# Altium schematic symbol library lib_datalogger.SchLib: 1246 symbols (part 3 of 16) (continued)
## CMP-004-00007-3
designator D?, comment 1N4007
General Purpose Rectifier, 1.1 V, 1.0 A, -55 to 175 degC, 2-Pin DO-41, RoHS, Tape and Reel; Manufacturer: Fairchild; Package Version: Rev. 2, 09/2008; Forward Current: 1A; Elements: 1; Max Surge Current: 30A; Peak Reverse Current: 5uA; Forward Voltage: 1.1V; Package Reference: DO-41-2; Package Description: 2-Pin Axial Lead, Dia 2.375 mm, Body Length 4.63 mm; Min Operating Temperature: -55°C; Packaging: TapeandReel; Max Operating Temperature: 175°C; Pins: 2; Package Quantity: 5000; Datasheet URL: https://www.fairchildsemi.com/datasheets/1N/1N4007.pdf; Case/Package: DO-41-2; Package URL: http://www.fairchildsemi.com/dwg/DO/DO41A.pdf; RoHS Compliant: True; Mounting Technology: TH; Datasheet Version: Rev. 1.1.0, 11/2014; Manufacturer URL: https://www.fairchildsemi.com/
footprint FAIR-DO-41-2-1 (THD, 2-Leads, Body 5.2x2.72mm, Pin Spacing 7.8mm)
pins: 1 K, 2 A

## CMP-004-000008-1
designator C?, comment CAP ALUM 330UF 20% 50V SMD  Tolerance: ±20%  Packaging: Cut Tape (CT)  Capacitance: 330µF  Manufacturer: Panasonic Electronic Components  Voltage Rating: 50V  Ripple Current: 585mA
Manufacturer Part Number: EEE-FT1H331AP; Polarization: Polar; Surface Mount Land Size: 0.406" L x 0.406" W (10.30mm x 10.30mm); ESR (Equivalent Series Resistance): 120 mOhm @ 100kHz; Lifetime @ Temp.: 2000 Hrs @ 105°C; ComponentLink1URL: https://industrial.panasonic.com/cdbs/www-data/pdf/RDE0000/ABA0000C573.pdf; Impedance: -; Applications: General Purpose; Mounting Type: Surface Mount; Pricing 1: 1=1.04, 10=0.818, 25=0.75, 50=0.709, 100=0.6135, 250=0.54536 (USD); Stock 1: 74009; ComponentLink1Description: https://industrial.panasonic.com/cdbs/www-data/pdf/RDE0000/ABA0000C573.pdf; Lead Spacing: -; Height - Seated (Max): 0.413" (10.50mm); Operating Temperature: -55°C ~ 105°C; Design Item ID: CAP ALUM 330UF 20% 50V SMD; Size / Dimension: 0.394" Dia (10.00mm); Category: Capacitors; RoHS: RoHS Compliant; Source: mits.SchLib; Part Status: Active; Package / Case: Radial, Can - SMD
footprint CAP_SMD_D100_P46_H120
footprint CAP_SMD_D100_P46_H120
pins: 1, 2
1 alternate drawing of the same symbol

## CMP-004-00008-2
designator D?, comment MBR360G
Axial Lead Rectifier, 60 V, 3 A, -65 to 150 degC, 2-Pin DO-201AD, RoHS, Bag; Manufacturer: ON Semiconductor; Forward Current: 3A; Forward Voltage: 1.08V; Peak Reverse Current: 600uA; Max Surge Current: 80A; Package URL: http://www.onsemi.com/pub_link/Collateral/267-05.PDF; Datasheet URL: http://www.onsemi.cn/pub_link/Collateral/MBR350-D.PDF; Package Description: 2-Pin Axial Lead, Dia 5.05 mm, Body Length 8.4 mm; Package Reference: AXIAL_LEAD-2-267-05; Diameter: 5.3mm; Datasheet Version: Rev. 6, 06/2006; Package Quantity: 500; Packaging: Bulk; Manufacturer URL: http://www.onsemi.com/; Pins: 2; Max Operating Temperature: 150°C; Min Operating Temperature: -65°C; Mounting Technology: TH; RoHS Compliant: True; Case/Package: AXIAL_LEAD-2-267-05
footprint ONSC-AXIAL_LEAD-2-267-05_V (AXIAL, 2-Leads, Diameter 5.05mm)
pins: 1 A, 2 K

## CMP-004-000009-1
designator C?, comment CAP ALUM 330uF 35V 20% SMD  Manufacturer: Panasonic Electronic Components
Part#: EEE-FK1V331P; eVendor#: PCE3841CT-ND; eVendorPrice: 1,09; MSRP: 0,54; eVendor: Digi-Key; MOQ: 250; Source: mits.SchLib; Datasheet: http://industrial.panasonic.com/www-cgi/jvcr13pz.cgi?E+PZ+3+ABA0120+EEEFK1V331P+7+WW; Design Item ID: CAP ALUM 330uF 35V 20% SMD
footprint CAP_SMD_D5_H6
footprint CAP_SMD_D100_P46_H120
pins: 1, 2
1 alternate drawing of the same symbol

## CMP-004-00009-2
designator D?, comment 1N5819
Low Drop Power Schottky Rectifier, 40 V, 1 A, 2-Pin DO-41, RoHS; Manufacturer: ON Semiconductor; Max Surge Current: 25A; Forward Current: 1A; Package Version: Rev. U, 02/2005; Peak Reverse Current: 1mA; Max Operating Temperature: 125°C; Case/Package: DO; Package URL: http://www.onsemi.cn/pub_link/Collateral/59-10.PDF; Packaging: Bulk; Manufacturer URL: http://www.onsemi.com/; Min Operating Temperature: -65°C; Package Description: 2-Pin, Axial Lead, Diameter 2.35 mm; Mounting Technology: TH; Datasheet URL: http://www.onsemi.cn/pub_link/Collateral/1N5817-D.PDF; Datasheet Version: Rev. 10, 07/2006; Package Reference: AXIAL_LEAD-2-59-10; Pins: 2; RoHS Compliant: True
footprint ONSC-AXIAL_LEAD-2-59-10_P (AXIAL, 2-Leads, Diameter 2.35mm)
pins: 1 A, 2 K

## CMP-004-00010-2
designator D?, comment BAS70-04,215
General-Purpose Schottky Diode, 70 V, 70 mA, -65 to 150 degC, 3-Pin SOT23, RoHS, Tape and Reel; Manufacturer: NXP; Max Surge Current: 100mA; Forward Current: 70mA; Peak Reverse Current: 10uA; Package Version: Feb-16; Forward Voltage: 1V; Packaging: TapeandReel; Mounting Technology: SM; Datasheet Version: Rev. 09, 01/2010; Datasheet URL: http://www.nxp.com/documents/data_sheet/BAS70_1PS7XSB70_SER.pdf; Package Quantity: 3000; Min Operating Temperature: -65°C; RoHS Compliant: True; Pins: 3; Package Reference: SOT23-3; Package Description: 3-Pin Small Outline Transistor, Body 1.3 x 2.9 mm, Pitch 0.95 mm; Case/Package: TO-236-3; Package URL: http://www.nxp.com/documents/outline_drawing/SOT23.pdf; Manufacturer URL: http://www.nxp.com/; Max Operating Temperature: 150°C
footprint NXP-SOT23-3_V (SOT23, 3-Leads, Body 2.9x1.3mm, Pitch 0.95mm)
pins: 1 A, 2 K, 3 C

## CMP-004-000010-3
designator C?, comment CAP ALUM 4.7UF 20% 35V SMD  Case/Package: Radial  Packaging: Cut Tape (CT)  Capacitance: 10µF  Voltage Rating: 16V  Tolerance: ±20%  Package Quantity: 2000  Min Operating Temperature: -40°C  Ripple Current (AC): 18mA  Lead Pitch: 1mm  Diameter: 4mm  Ripple Current: 28mA  Max Operating Temperature: 85°C  Manufacturer: Panasonic Electronic Components
Manufacturer Part Number: EEE-HB1C100R; Dielectric Material: Aluminium; Life (Hours): 2000Hour; Surface Mount Land Size: 0.169" L x 0.169" W (4.30mm x 4.30mm); Lead Diameter: 0.8mm; Leakage Current: 3uA; Lifetime @ Temp.: 2000 Hrs @ 105°C; Polarization: Polar; Dissipation Factor: 0.12%; ComponentLink1Description: https://industrial.panasonic.com/cdbs/www-data/pdf/RDE0000/ABA0000C1157.pdf; ComponentLink9Description: https://datasheet.ciiva.com/28640/1912851-28640459.pdf?src-supplier=Element14; Width: 0.25inch; Termination: SMD/SMT; ComponentLink3URL: https://datasheet.ciiva.com/96/e-wx-96069.pdf?src-supplier=Digi-Key; Pricing 1: 1=0.31, 10=0.21, 25=0.1684, 50=0.1402, 100=0.1192, 250=0.09468, 500=0.08414, 1000=0.07363 (USD); Pricing 2: 1=0,27000, 10=0,18300, 100=0,10390, 500=0,07334, 1000=0,06418 (USD); Part Status: Active; Category: Capacitors; Size / Dimension: 0.157" Dia (4.00mm); Lead Free: Lead Free; Weight: 0.01lb; ComponentLink7URL: https://datasheet.ciiva.com/11688/e-wx-11688390.pdf?src-supplier=Avnet; ComponentLink4URL: https://datasheet.ciiva.com/30522/getdatasheetpartid-427113-30522272.pdf?src-supplier=Verical; Radiation Hardening: No; ComponentLink2Description: https://datasheet.ciiva.com/96/e-wx-96068.pdf?src-supplier=Digi-Key; Contact Plating: Tin; Height - Seated (Max): 0.228" (5.80mm); Stock 3: 17093; Mounting Type: Surface Mount; ComponentLink10URL: https://datasheet.ciiva.com/16539/e-wx-16539500.pdf?src-supplier=Avnet+Asia; ComponentLink11URL: https://datasheet.ciiva.com/17534/e-wx-17534878.pdf?src-supplier=Avnet+Europe; ComponentLink11Description: https://datasheet.ciiva.com/17534/e-wx-17534878.pdf?src-supplier=Avnet+Europe; ComponentLink3Description: https://datasheet.ciiva.com/96/e-wx-96069.pdf?src-supplier=Digi-Key; Lead Spacing: -; Stock 1: 25234; ComponentLink4Description: https://datasheet.ciiva.com/30522/getdatasheetpartid-427113-30522272.pdf?src-supplier=Verical; ESR (Equivalent Series Resistance): -; Pricing 3: 1=0,27000, 10=0,18300, 100=0,10390, 500=0,07334, 1000=0,06418 (USD); ComponentLink6URL: https://datasheet.ciiva.com/96/e-wx-96070.pdf?src-supplier=Digi-Key; ComponentLink2URL: https://datasheet.ciiva.com/96/e-wx-96068.pdf?src-supplier=Digi-Key; Length: 5.4mm; ComponentLink5URL: https://datasheet.ciiva.com/11782/0900766b80fa3a90-11782001.pdf?src-supplier=RSComponents; ComponentLink9URL: https://datasheet.ciiva.com/28640/1912851-28640459.pdf?src-supplier=Element14; ComponentLink6Description: https://datasheet.ciiva.com/96/e-wx-96070.pdf?src-supplier=Digi-Key; Mount: Surface Mount,PCB; RoHS: RoHS Compliant; ComponentLink5Description: https://datasheet.ciiva.com/11782/0900766b80fa3a90-11782001.pdf?src-supplier=RSComponents; Source: mits.SchLib; REACH SVHC: No SVHC; ComponentLink10Description: https://datasheet.ciiva.com/16539/e-wx-16539500.pdf?src-supplier=Avnet+Asia; Number of Pins: 2; Stock 2: 17093; Operating Temperature: -40°C ~ 105°C; ComponentLink8URL: https://datasheet.ciiva.com/5360/e-wx-11809-5360377.pdf?src-supplier=Mouser; Height: 5.4mm; Applications: Automotive; Package / Case: Radial, Can - SMD; Design Item ID: CAP ALUM 4.7UF 20% 35V SMD; Impedance: -; ComponentLink8Description: https://datasheet.ciiva.com/5360/e-wx-11809-5360377.pdf?src-supplier=Mouser; Voltage Rating (DC): 35V; Voltage: 35V; ComponentLink1URL: https://industrial.panasonic.com/cdbs/www-data/pdf/RDE0000/ABA0000C1157.pdf; ComponentLink7Description: https://datasheet.ciiva.com/11688/e-wx-11688390.pdf?src-supplier=Avnet
footprint CAP_SMD_D5_H6
footprint CAP_SMD_D4
pins: 1, 2
1 alternate drawing of the same symbol

## CMP-004-000011-1
designator C?, comment CAP ALUM 470uF 35V 20% SMD  Package Quantity: 1  Max Operating Temperature: 105°C  Tolerance: 20%  Capacitance: 470uF  Min Operating Temperature: -55°C  Case/Package: Radial  Manufacturer: Nichicon  Voltage Rating: 35V  Packaging: Tape and Reel  Diameter: 10mm  Ripple Current (AC): 1.19A
CAP ALUM 470UF 20% 35V SMD; Manufacturer Part Number: UCL1V471MNL1GS; Life (Hours): 2000Hour; Leakage Current: 3uA; Material: Aluminium; Dissipation Factor: 0.12%; Impedance: 60mR; Pricing 1: 1=1,06000, 10=0,80300, 100=0,57450 (USD); ComponentLink13URL: https://datasheet.ciiva.com/24229/aba0000ce120-24229287.pdf?src-supplier=Mouser; Design Item ID: CAP ALUM 470uF 35V 20% SMD; ComponentLink6Description: https://datasheet.ciiva.com/14599/70258115-14599980.pdf?src-supplier=Allied+Electronics; ComponentLink5Description: https://datasheet.ciiva.com/15225/getdatasheetpartid-199809-15225692.pdf?src-supplier=Verical; ComponentLink23Description: https://datasheet.ciiva.com/28458/1910939-28458006.pdf?src-supplier=Element14; ComponentLink14URL: https://datasheet.ciiva.com/31417/1676921-31417910.pdf?src-supplier=Farnell; Source: mits.SchLib; Voltage Rating (DC): 35V; ComponentLink11Description: https://datasheet.ciiva.com/8081/1676921-8081433.pdf?src-supplier=Element14; ComponentLink17Description: https://datasheet.ciiva.com/46372/1676921-46372495.pdf?src-supplier=Element14; ComponentLink19URL: https://datasheet.ciiva.com/98/e-cl-98467.pdf?src-supplier=Digi-Key; Length: 13.5mm; ComponentLink9URL: https://datasheet.ciiva.com/14592/70068597-14592122.pdf?src-supplier=Allied+Electronics; ComponentLink24URL: https://datasheet.ciiva.com/6153/e-cl-6153975.pdf?src-supplier=Farnell; ComponentLink5URL: https://datasheet.ciiva.com/15225/getdatasheetpartid-199809-15225692.pdf?src-supplier=Verical; ComponentLink15URL: https://datasheet.ciiva.com/43470/1676921-43470869.pdf?src-supplier=Farnell; Category: Aluminum Electrolytic Capacitors; Stock 1: 36281; ComponentLink1Description: https://datasheet.ciiva.com/11783/0900766b80e4e8b0-11783536.pdf?src-supplier=RSComponents; ComponentLink26URL: https://datasheet.ciiva.com/16502/e-cl-16502287.pdf?src-supplier=Future+Electronics; ComponentLink3URL: https://datasheet.ciiva.com/48483/aba0000ce120-48483341.pdf?src-supplier=Avnet; Mount: Surface Mount; ComponentLink12Description: https://datasheet.ciiva.com/46379/1676921-46379192.pdf?src-supplier=Element14; Termination: SMD/SMT; ComponentLink18Description: https://datasheet.ciiva.com/30521/getdatasheetpartid-743876-30521937.pdf?src-supplier=Verical; ComponentLink11URL: https://datasheet.ciiva.com/8081/1676921-8081433.pdf?src-supplier=Element14; ComponentLink10Description: https://datasheet.ciiva.com/2984/aba0000ce120-2984090.pdf?src-supplier=Avnet; REACH SVHC: No SVHC; ComponentLink20URL: https://datasheet.ciiva.com/98/e-cl-98468.pdf?src-supplier=Digi-Key; ComponentLink24Description: https://datasheet.ciiva.com/6153/e-cl-6153975.pdf?src-supplier=Farnell; ComponentLink6URL: https://datasheet.ciiva.com/14599/70258115-14599980.pdf?src-supplier=Allied+Electronics; ComponentLink26Description: https://datasheet.ciiva.com/16502/e-cl-16502287.pdf?src-supplier=Future+Electronics; ComponentLink4URL: https://datasheet.ciiva.com/30252/eev-fkseries-30252141.pdf?src-supplier=Onlinecomponents.com; ComponentLink22Description: https://datasheet.ciiva.com/22661/1910939-22661894.pdf?src-supplier=Element14; ComponentLink4Description: https://datasheet.ciiva.com/30252/eev-fkseries-30252141.pdf?src-supplier=Onlinecomponents.com; ComponentLink7Description: https://datasheet.ciiva.com/28692/1676921-28692730.pdf?src-supplier=Element14; ComponentLink22URL: https://datasheet.ciiva.com/22661/1910939-22661894.pdf?src-supplier=Element14; ComponentLink19Description: https://datasheet.ciiva.com/98/e-cl-98467.pdf?src-supplier=Digi-Key; ComponentLink16URL: https://datasheet.ciiva.com/17355/aba0000ce120-17355694.pdf?src-supplier=Avnet+Europe; RoHS: Yes; ComponentLink14Description: https://datasheet.ciiva.com/31417/1676921-31417910.pdf?src-supplier=Farnell; ComponentLink16Description: https://datasheet.ciiva.com/17355/aba0000ce120-17355694.pdf?src-supplier=Avnet+Europe; Radiation Hardening: No; ComponentLink2URL: https://datasheet.ciiva.com/29313/443482-da-01-en-smd-elko-vfk-h13-470-uf-35v-29313589.pdf?src-supplier=Conrad; ComponentLink21Description: https://datasheet.ciiva.com/98/e-cl-98469.pdf?src-supplier=Digi-Key; ComponentLink2Description: https://datasheet.ciiva.com/29313/443482-da-01-en-smd-elko-vfk-h13-470-uf-35v-29313589.pdf?src-supplier=Conrad; ComponentLink10URL: https://datasheet.ciiva.com/2984/aba0000ce120-2984090.pdf?src-supplier=Avnet; ComponentLink18URL: https://datasheet.ciiva.com/30521/getdatasheetpartid-743876-30521937.pdf?src-supplier=Verical; Number of Pins: 2; Dielectric Material: Aluminium; ComponentLink25URL: https://datasheet.ciiva.com/11683/e-cl-11683743.pdf?src-supplier=Avnet; ComponentLink12URL: https://datasheet.ciiva.com/46379/1676921-46379192.pdf?src-supplier=Element14; ComponentLink20Description: https://datasheet.ciiva.com/98/e-cl-98468.pdf?src-supplier=Digi-Key; ComponentLink13Description: https://datasheet.ciiva.com/24229/aba0000ce120-24229287.pdf?src-supplier=Mouser; ComponentLink8URL: https://datasheet.ciiva.com/14592/70258115-14592362.pdf?src-supplier=Allied+Electronics; ComponentLink21URL: https://datasheet.ciiva.com/98/e-cl-98469.pdf?src-supplier=Digi-Key; ComponentLink25Description: https://datasheet.ciiva.com/11683/e-cl-11683743.pdf?src-supplier=Avnet; Height: 13.5mm; ComponentLink8Description: https://datasheet.ciiva.com/14592/70258115-14592362.pdf?src-supplier=Allied+Electronics; ComponentLink3Description: https://datasheet.ciiva.com/48483/aba0000ce120-48483341.pdf?src-supplier=Avnet; Lead Free: Lead Free; ComponentLink23URL: https://datasheet.ciiva.com/28458/1910939-28458006.pdf?src-supplier=Element14; ComponentLink15Description: https://datasheet.ciiva.com/43470/1676921-43470869.pdf?src-supplier=Farnell; ComponentLink9Description: https://datasheet.ciiva.com/14592/70068597-14592122.pdf?src-supplier=Allied+Electronics; ComponentLink17URL: https://datasheet.ciiva.com/46372/1676921-46372495.pdf?src-supplier=Element14; ComponentLink7URL: https://datasheet.ciiva.com/28692/1676921-28692730.pdf?src-supplier=Element14; Height - Seated (Max): 0.531inch; ComponentLink1URL: https://datasheet.ciiva.com/11783/0900766b80e4e8b0-11783536.pdf?src-supplier=RSComponents; Ripple Current: 1.19A
footprint CAP_SMD_D5_H6
footprint CAP_SMD_D100_P46_H120
pins: 1, 2
1 alternate drawing of the same symbol

## CMP-004-00011-2
designator D?, comment BAS70-04-7-F
Schottky Barrier Diode, 70 V, 70 mA, -55 to 125 degC, 3-Pin SOT23, RoHS, Tape and Reel; Manufacturer: Diodes Inc; Recovery Time: 5ns; Max Surge Current: 100mA; Forward Voltage: 1V; Forward Current: 70mA; Power: 200mW; Element Configuration: CommonCathode; Peak Reverse Current: 0.1uA; Elements: 2; Manufacturer URL: http://www.diodes.com/; Packaging: TapeandReel; Package Reference: SOT23-3; Mounting Technology: SM; Datasheet URL: http://www.diodes.com/_files/datasheets/ds11007.pdf; Max Operating Temperature: 125°C; Datasheet Version: Rev. 24-2, 08/2014; Min Operating Temperature: -55°C; Pins: 3; Case/Package: TO-236-3; Package Quantity: 3000; Package Description: 3-Pin Small Outline Transistor, Body 2.9 x 1.3 mm, Pitch 0.96 mm; RoHS Compliant: True
footprint DIOD-SOT23-3_V (SOT23, 3-Leads, Body 3x1.4mm, Pitch 0.95mm)
pins: 1 A, 2 K, 3 C

## CMP-004-000012-2
designator C?, comment CAP CER 150nF 16V 0603 SMD
CAP CER 150nF 16V 0603 Multilayer; Manufacturer 1: FH(Guangdong Fenghua Advanced Tech); Manufacturer Part Number 1: 0603B154K160NT; Source: mits.SchLib; Supplier Unit Price 1: 0,0207; Design Item ID: CAP CER 150nF 16V 0603 SMD
footprint CC1005-0402 (Chip Capacitor; Body 0.039" L x 0.020" W (1.00mm x 0.50mm))
footprint CC1608-0603 (Chip Capacitor; Body 1.6 x 0.8 mm (LxW typ))
pins: 1, 2

## CMP-004-00012-2
designator D?, comment BAS70-04-E3-08
Small Signal Schottky Diode, 70 V, 200 mA, -55 to 125 degC, 3-Pin SOT23, RoHS, Tape and Reel; Manufacturer: Vishay Semiconductor; Max Surge Current: 600mA; Forward Voltage: 1V; RoHS Compliant: True; Min Operating Temperature: -55°C; Datasheet Version: Rev. 2.0, 02/2013; Datasheet URL: http://www.vishay.com/docs/85702/bas70.pdf; Package Reference: SOT23-3; Package URL: http://www.vishay.com/docs/71196/71196.pdf; Manufacturer URL: http://www.vishay.com/; Pins: 3; Package Description: 3-Pin Small Outline Transistor, Body 2.95 x 1.315 mm, Pitch 0.95 mm; Max Operating Temperature: 125°C; Mounting Technology: SM; Packaging: TapeandReel; Package Quantity: 1; Case/Package: TO-236-3
footprint VISH-SOT23-3_V (SOT23, 3-Leads, Body 3.1x1.43mm, Pitch 0.95mm)
pins: 1 A, 2 K, 3 C

## CMP-004-000013-1
designator C?, comment CAP ALUM 100UF 20% 6.3V SMD  Tolerance: ±20%  Voltage Rating: 6.3V  Capacitance: 100µF  Manufacturer: Panasonic Electronic Components  Packaging: Cut Tape (CT)  Ripple Current: 47mA
Manufacturer Part Number: EEE-0JA101WR; Polarization: Polar; Surface Mount Land Size: 0.209" L x 0.209" W (5.30mm x 5.30mm); Lifetime @ Temp.: 1000 Hrs @ 85°C; Height - Seated (Max): 0.213" (5.40mm); Stock 1: 70730; Source: mits.SchLib; ESR (Equivalent Series Resistance): -; Part Status: Active; ComponentLink1URL: https://industrial.panasonic.com/cdbs/www-data/pdf/RDE0000/ABA0000C1145.pdf; Lead Spacing: -; Design Item ID: CAP ALUM 100UF 20% 6.3V SMD; ComponentLink1Description: https://industrial.panasonic.com/cdbs/www-data/pdf/RDE0000/ABA0000C1145.pdf; Operating Temperature: -40°C ~ 85°C; RoHS: RoHS Compliant; Applications: General Purpose; Package / Case: Radial, Can - SMD; Mounting Type: Surface Mount; Size / Dimension: 0.197" Dia (5.00mm); Pricing 1: 1=0.29, 10=0.201, 25=0.1648, 50=0.1408, 100=0.1206, 250=0.10052, 500=0.09048 (USD); Impedance: -; Category: Capacitors
footprint CAP_SMD_D5_H6
footprint CAP_SMD_D5_H6
pins: 1, 2
1 alternate drawing of the same symbol

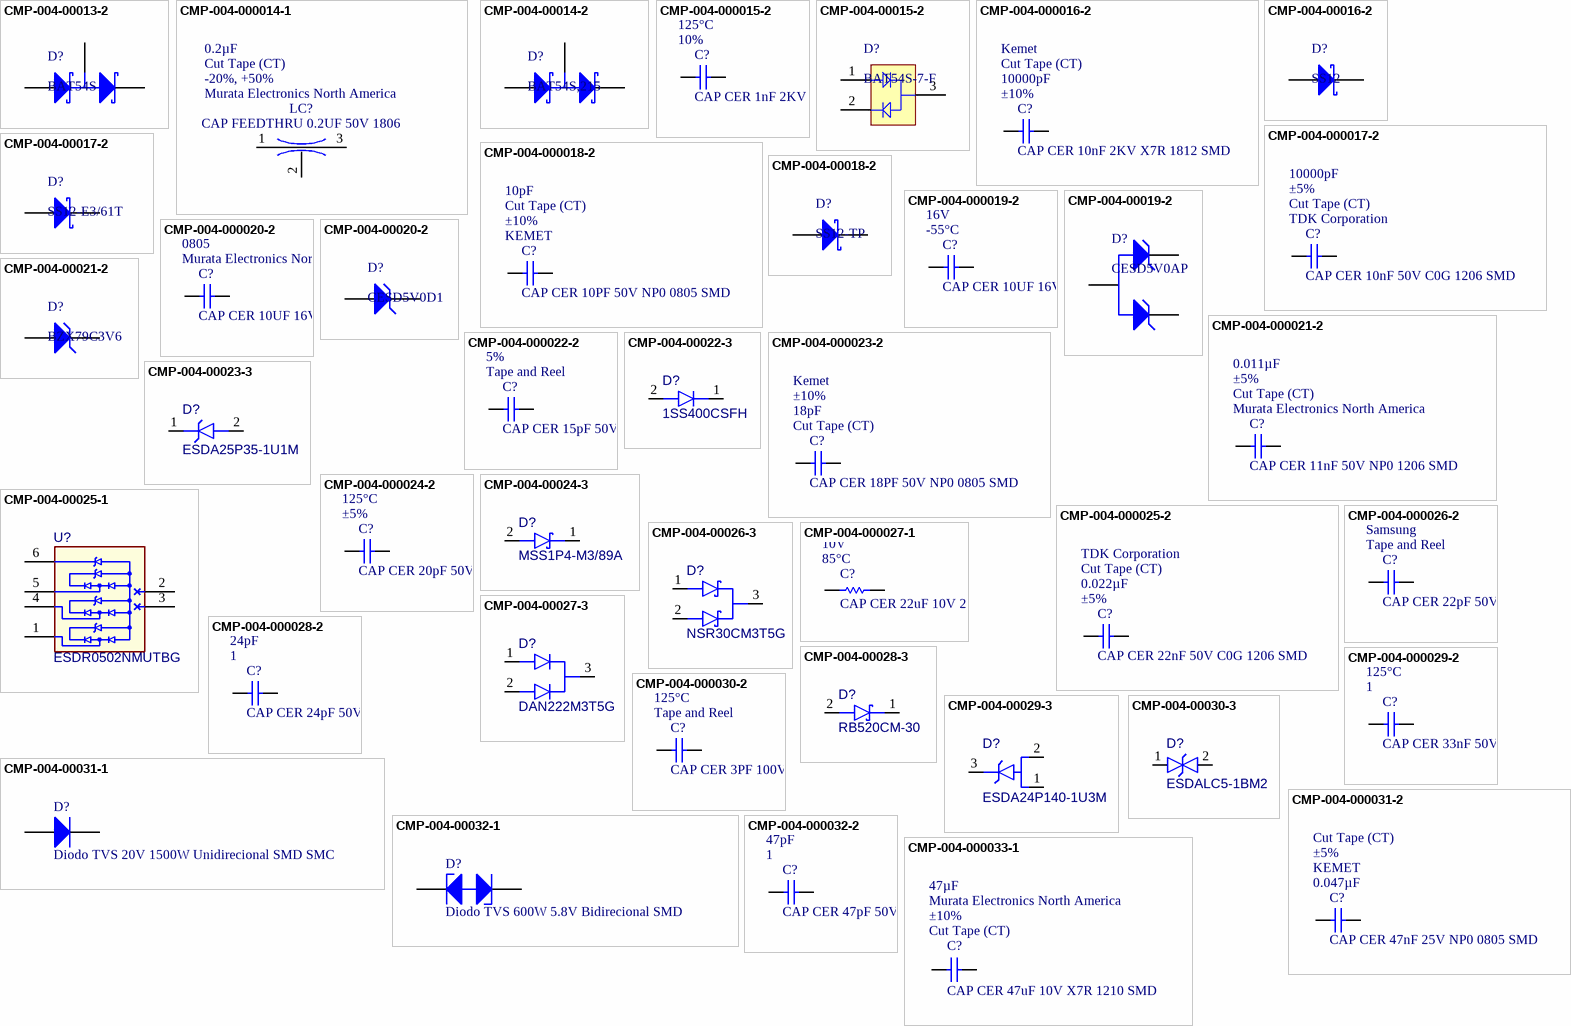
[diagram p8: symbols CMP-004-00013-2 to CMP-004-000033-1]

## CMP-004-00013-2
designator D?, comment BAT54S
Schottky Barrier Diode, 30 V, 0.2 A, -55 to 150 degC, 3-Pin SOT23, RoHS, Tape and Reel; Manufacturer: Fairchild; Recovery Time: 5ns; Package Version: Rev. 12, 03/2016; Forward Current: 200mA; Peak Reverse Current: 2uA; Elements: 2; Forward Voltage: 800mV; Max Surge Current: 600mA; Package Reference: SOT23-3; RoHS Compliant: True; Package URL: http://www.fairchildsemi.com/dwg/MA/MA03D.pdf; Pins: 3; Max Operating Temperature: 150°C; Package Quantity: 3000; Datasheet URL: https://www.fairchildsemi.com/datasheets/BA/BAT54S.pdf; Packaging: TapeandReel; Manufacturer URL: https://www.fairchildsemi.com/; Min Operating Temperature: -55°C; Datasheet Version: Rev. 2.3, 04/2016; Mounting Technology: SM; Package Description: 3-Pin Small Outline Transistor, Body 2.92 x 1.325 mm, Pitch 0.95 mm; Case/Package: SOT-23
footprint FAIR-SOT23-3_V (SOT23, 3-Leads, Body 3.12x1.5mm, Pitch 0.95mm)
pins: 1 A, 2 K, 3 C

## CMP-004-000014-1
designator LC?, comment CAP FEEDTHRU 0.2UF 50V 1806  Manufacturer: Murata Electronics North America  Tolerance: -20%, +50%  Packaging: Cut Tape (CT)  Capacitance: 0.2µF
Manufacturer Part Number: NFM41PC204F1H3L; DC Resistance (DCR) (Max): 40 mOhm; Current: 2A; Source: mits.SchLib; Design Item ID: CAP FEEDTHRU 0.2UF 50V 1806; Thread Size: -; Category: Filters; Temperature Coefficient: -; Mounting Type: Surface Mount; Insertion Loss: -; Pricing 1: 1=0.87, 10=0.832, 25=0.8048, 50=0.6574, 100=0.5902, 250=0.5366, 500=0.50976, 1000=0.45609 (USD); Part Status: Active; Operating Temperature: -55°C ~ 85°C; Package / Case: 1806 (4516 Metric), 3 PC Pad; Size / Dimension: 0.177" L x 0.063" W (4.50mm x 1.60mm); ComponentLink1Description: http://search.murata.co.jp/Ceramy/image/img/A01X/G101/ENG/NFM41PC155B1E3-01.pdf; RoHS: RoHS Compliant; Height (Max): 0.047" (1.20mm); Stock 1: 53274; Ratings: -; Voltage - Rated: 50V; ComponentLink1URL: http://search.murata.co.jp/Ceramy/image/img/A01X/G101/ENG/NFM41PC155B1E3-01.pdf
footprint CC_FT_0805
footprint NFM41C (NFM41C Series Footprint)
pins: 1 Input, 2 GND, 3 Output

## CMP-004-00014-2
designator D?, comment BAT54S,215
BAT54 Series Schottky Barrier Diode, 30 V, 200 mA, -55 to 150 degC, 3-Pin SOT23 (TO-236AB), RoHS, Tape and Reel; Manufacturer: NXP; Peak Reverse Current: 2uA; Elements: 2; Forward Current: 200mA; Forward Voltage: 800mV; Max Surge Current: 600mA; Recovery Time: 5ns; Package URL: http://www.nxp.com/documents/outline_drawing/SOT23.pdf; Pins: 3; Packaging: TapeandReel; Package Reference: SOT23; Datasheet URL: http://www.nxp.com/documents/data_sheet/BAT54_SER.pdf; Package Description: 3-Pin Small Outline Transistor, Body 2.9 x 1.3 mm, Pitch 0.95 mm; Manufacturer URL: http://www.nxp.com/; Case/Package: TO-236-3; Min Operating Temperature: -55°C; Max Operating Temperature: 150°C; Mounting Technology: SM; RoHS Compliant: True; Datasheet Version: Rev. 5, 10/2012; Package Quantity: 3000
footprint NXP-SOT23_L (SOT23, 3-Leads, Body 3x1.4mm, Pitch 0.95mm, IPC High Density)
footprint NXP-SOT23_M (SOT23, 3-Leads, Body 3x1.4mm, Pitch 0.95mm, IPC Low Density)
footprint NXP-SOT23_N (SOT23, 3-Leads, Body 3x1.4mm, Pitch 0.95mm, IPC Medium Density)
pins: 1 A, 2 K, 3 C

## CMP-004-000015-2
designator C?, comment CAP CER 1nF 2KV NP0 1206 SMD  Tolerance: 10%  Max Operating Temperature: 125°C  Capacitance: 1nF  Voltage Rating: 2kV  Package Quantity: 500  Case/Package: 1206  Packaging: Tape and Reel  Min Operating Temperature: -55°C
1NF ±10% 2KV X7R 1206 MULTILAYER CERAMIC CAPACITORS MLCC - SMD/SMT ROHS; Manufacturer Part Number 1: 1206B102K202NT; Manufacturer 1: Knowles Novacap; Height: 1.63mm; Voltage Rating (DC): 2kV; ComponentLink1Description: https://datasheet.lcsc.com/szlcsc/1810311314_FH-Guangdong-Fenghua-Advanced-Tech-1206B102K202NT_C9196.pdf; Design Item ID: CAP CER 1nF 2KV NP0 1206 SMD; ComponentLink1URL: https://datasheet.lcsc.com/szlcsc/1810311314_FH-Guangdong-Fenghua-Advanced-Tech-1206B102K202NT_C9196.pdf; Termination: SMD/SMT; Dielectric: X7R; Case Code (Imperial): 1206; Width: 1.52mm; Source: mits.SchLib; Length: 3.18mm; Case Code (Metric): 3216; Category: Ceramic Capacitors
footprint CC1005-0402 (Chip Capacitor; Body 0.039" L x 0.020" W (1.00mm x 0.50mm))
footprint CC3216-1206 (Chip Capacitor; Body 3.2 x 1.6 mm (LxW typ))
pins: 1, 2

## CMP-004-00015-2
designator D?, comment BAT54S-7-F
Surface Mount Schottky Barrier Diode, 30 V, 200 mA, -65 to 150 degC, 3-Pin SOT23, RoHS, Tape and Reel; Manufacturer: Diodes Inc; Max Surge Current: 600mA; Elements: 2; Forward Voltage: 800mV; Peak Reverse Current: 2uA; Recovery Time: 5ns; Forward Current: 200mA; Element Configuration: CommonCathode; Power: 200mW; Datasheet Version: Rev. 31-2, 10/2013; Package Quantity: 3000; RoHS Compliant: True; Packaging: TapeandReel; Datasheet URL: http://www.diodes.com/_files/datasheets/ds11005.pdf; Case/Package: TO-236-3; Max Operating Temperature: 125°C; Min Operating Temperature: -65°C; Manufacturer URL: http://www.diodes.com/; Package Reference: SOT23-3; Mounting Technology: SM; Pins: 3; Package Description: 3-Pin Small Outline Transistor, Body 2.9 x 1.3 mm, Pitch 0.96 mm
footprint DIOD-SOT23-3_V (SOT23, 3-Leads, Body 3x1.4mm, Pitch 0.95mm)
pins: 1 A, 2 K, 3 C

## CMP-004-000016-2
designator C?, comment CAP CER 10nF 2KV X7R 1812 SMD  Tolerance: ±10%  Capacitance: 10000pF  Packaging: Cut Tape (CT)  Manufacturer: Kemet
CAP CER 10000PF 2KV X7R 1812; Part#: C1812C103KGRACTU; MSRP: 0,64652; eVendor#: 399-10477-1-ND; eVendorPrice: 1,35; eVendor: Digi-Key; Voltage - Rated: 2000V (2kV); Pricing 1: 1=1.32, 10=1.083, 50=0.9508, 100=0.7659, 250=0.63384 (USD); Lead Spacing: -; Category: Capacitors; Ratings: -; Lead Style: -; Operating Temperature: -55°C ~ 125°C; ComponentLink1URL: http://www.kemet.com/docfinder?Partnumber=C1812C103KGRACTU; Features: High Voltage; Stock 1: 5156; Size / Dimension: 0.177" L x 0.126" W (4.50mm x 3.20mm); Height - Seated (Max): -; Mounting Type: Surface Mount, MLCC; Manufacturer Part Number: C1812C103KGRACTU; Thickness (Max): 0.106" (2.70mm); Applications: SMPS Filtering; ComponentLink1Description: http://www.kemet.com/docfinder?Partnumber=C1812C103KGRACTU; RoHS: RoHS Compliant; Design Item ID: CAP CER 10nF 2KV X7R 1812 SMD; MOQ: 250; Datasheet: http://www.kemet.com/docfinder?Partnumber=C1812C103KGRACTU; Source: mits.SchLib; Temperature Coefficient: X7R; Package / Case: 1812 (4532 Metric)
footprint CC1005-0402 (Chip Capacitor; Body 0.039" L x 0.020" W (1.00mm x 0.50mm))
footprint CC4532-1812 (Chip Capacitor)
pins: 1, 2

## CMP-004-00016-2
designator D?, comment SS12
Schottky Rectifier, 20 V, 1 A, -65 to 125 degC, 2-Pin DO-214AC, RoHS, Tape and Reel; Manufacturer: Fairchild; Forward Voltage: 500mV; Peak Reverse Current: 200uA; Max Surge Current: 40A; Min Operating Temperature: -65°C; Packaging: TapeandReel; Datasheet URL: https://www.fairchildsemi.com/datasheets/SS/SS12.pdf; Datasheet Version: Rev. 1.9, 01/2015; Package URL: https://www.fairchildsemi.com/package-drawings/DO/DO214AC.pdf; Package Description: 2-Pin Surface Mount Device, Body 4.375 x 2.725 mm; Manufacturer URL: https://www.fairchildsemi.com/; Mounting Technology: SM; Case/Package: SMA; RoHS Compliant: True; Package Quantity: 7500; Pins: 2; Max Operating Temperature: 125°C; Package Reference: DO-214AC-2
footprint FAIR-DO-214AC-2_V (DO-214, 2-Leads, Body 4.375x2.725mm)
pins: 1 A, 2 K

## CMP-004-000017-2
designator C?, comment CAP CER 10nF 50V C0G 1206 SMD  Manufacturer: TDK Corporation  Packaging: Cut Tape (CT)  Tolerance: ±5%  Capacitance: 10000pF
CAP CER 10000PF 50V C0G 1206; Manufacturer Part Number: C3216C0G1H103J060AA; Temperature Coefficient: C0G, NP0; ComponentLink1URL: https://product.tdk.com/info/en/catalog/datasheets/mlcc_commercial_general_en.pdf; Size / Dimension: 0.126" L x 0.063" W (3.20mm x 1.60mm); Source: mits.SchLib; RoHS: RoHS Compliant; Failure Rate: -; Voltage - Rated: 50V; Design Item ID: CAP CER 10nF 50V C0G 1206 SMD; Lead Spacing: -; Operating Temperature: -55°C ~ 125°C; Part Status: Active; Package / Case: 1206 (3216 Metric); Thickness (Max): 0.028" (0.70mm); Mounting Type: Surface Mount, MLCC; Applications: General Purpose; Lead Style: -; Ratings: -; Height - Seated (Max): -; Category: Capacitors; Stock 1: 121016; Pricing 1: 1=0.37, 10=0.325, 100=0.1626, 250=0.13008, 500=0.11848, 1000=0.10686 (USD); ComponentLink1Description: https://product.tdk.com/info/en/catalog/datasheets/mlcc_commercial_general_en.pdf; Features: Low ESL
footprint CC1005-0402 (Chip Capacitor; Body 0.039" L x 0.020" W (1.00mm x 0.50mm))
footprint CC3216-1206 (Chip Capacitor; Body 3.2 x 1.6 mm (LxW typ))
pins: 1, 2

## CMP-004-00017-2
designator D?, comment SS12-E3/61T
Schottky Barrier Rectifier, 20 V, 1 A, -65 to 150 degC, 2-Pin DO-214AC (SMA), RoHS, Tape and Reel; Manufacturer: Vishay Semiconductor; Forward Voltage: 500mV; Peak Reverse Current: 6mA; Max Surge Current: 40A; Forward Current: 1A; Package Quantity: 1800; Datasheet URL: http://www.vishay.com/docs/88746/ss12.pdf; Manufacturer URL: http://www.vishay.com/; Package Reference: DO-214AC (SMA); Max Operating Temperature: 125°C; Mounting Technology: SM; Case/Package: SMA; Min Operating Temperature: -65°C; Package Description: 2-Pin Surface Mount Device, Body 4.245 x 2.665 mm; RoHS Compliant: True; Datasheet Version: Aug-15; Pins: 2; Packaging: TapeandReel
footprint VISH-DO-214AC_V (Molded Diode, 2-Leads, Body 4.5x2.79mm)
pins: 1 A, 2 K

## CMP-004-000018-2
designator C?, comment CAP CER 10PF 50V NP0 0805 SMD  Manufacturer: KEMET  Tolerance: ±10%  Packaging: Cut Tape (CT)  Capacitance: 10pF
CAP CER 10PF 50V NP0 0805; Manufacturer Part Number: C0805C100K5GACTU; Temperature Coefficient: C0G, NP0; Applications: General Purpose; Failure Rate: -; Thickness (Max): 0.035" (0.88mm); Design Item ID: CAP CER 10PF 50V NP0 0805 SMD; Mounting Type: Surface Mount, MLCC; Lead Spacing: -; Voltage - Rated: 50V; Features: Low ESL; Lead Style: -; Category: Capacitors; Height - Seated (Max): -; RoHS: RoHS Compliant; Size / Dimension: 0.079" L x 0.049" W (2.00mm x 1.25mm); Package / Case: 0805 (2012 Metric); Source: mits.SchLib; Part Status: Active; Stock 1: 29127; ComponentLink1Description: http://www.kemet.com/docfinder?Partnumber=C0805C100K5GACTU; Pricing 1: 1=0.1, 10=0.057, 25=0.0416, 50=0.0312, 100=0.0255, 250=0.02132, 500=0.0182, 1000=0.0143 (USD); ComponentLink1URL: http://www.kemet.com/docfinder?Partnumber=C0805C100K5GACTU; Operating Temperature: -55°C ~ 125°C; Ratings: -
footprint CC1005-0402 (Chip Capacitor; Body 0.039" L x 0.020" W (1.00mm x 0.50mm))
footprint CC2012-0805 (Chip Capacitor)
pins: 1, 2

## CMP-004-00018-2
designator D?, comment SS12-TP
Schottky Rectifier, 20 V, 1 A, -55 to 125 degC, 2-Pin DO-214AC, RoHS, Tape and Reel; Manufacturer: Micro Commercial Components; Forward Voltage: 450mV; Max Surge Current: 30A; Forward Current: 1A; Peak Reverse Current: 500uA; Package Quantity: 1; Packaging: CutTape; Datasheet Version: Rev. B, 11/2011; Manufacturer URL: http://www.mccsemi.com/; Max Operating Temperature: 125°C; Pins: 2; Min Operating Temperature: -55°C; Package Reference: DO-214AC-2; Case/Package: SMA; Package Description: 2-Pin Molded Diode, Body 4.315 x 2.705 mm; Mounting Technology: SM; Datasheet URL: http://www.mccsemi.com/up_pdf/SS12-SS110(HSMA).PDF; RoHS Compliant: True
footprint MCC-DO-214AC-2_V (Molded Diode, 2-Leads, Body 4.57x2.84mm)
pins: 1 A, 2 K

## CMP-004-000019-2
designator C?, comment CAP CER 10UF 16V X5R 0603 SMD  Min Operating Temperature: -55°C  Voltage Rating: 16V  Packaging: Cut Tape (CT)  Tolerance: ±10%  Case/Package: 0805  Max Operating Temperature: 85°C  Package Quantity: 2000  Capacitance: 10µF  Manufacturer: Murata Electronics North America
CAP, 10µF, 25V, 20%, X5R, 0603; Manufacturer Part Number: GRM219R61A106KE44D; Voltage - Rated: 16; ComponentLink4URL: https://datasheet.ciiva.com/26946/getdatasheetpartid-354009-26946990.pdf?src-supplier=Verical; Features: -; ComponentLink6Description: http://www.farnell.com/datasheets/1885591.pdf?src-supplier=Newark; Temperature Coefficient: X5R; ComponentLink5Description: http://www.farnell.com/datasheets/2243360.pdf?src-supplier=Farnell; Thickness (Max): 0.037" (0.95mm); ComponentLink9URL: http://www.farnell.com/datasheets/2243360.pdf?src-supplier=Newark; ComponentLink4Description: https://datasheet.ciiva.com/26946/getdatasheetpartid-354009-26946990.pdf?src-supplier=Verical; Voltage: 25V; Stock 2: 240369; Size / Dimension: 0.079" L x 0.049" W (2.00mm x 1.25mm); ComponentLink7URL: http://www.farnell.com/datasheets/2243360.pdf?src-supplier=Element14; Package / Case: 0805 (2012 Metric); Ratings: -; ComponentLink8Description: https://search.murata.co.jp/Ceramy/image/img/A01X/G101/ENG/ZRB18AR61E106ME01-01.pdf?src-supplier=Digi-Key; Height - Seated (Max): -; Lead Style: -; ComponentLink3Description: https://datasheet.ciiva.com/16494/cl21a106kofnnne-16494380.pdf?src-supplier=Future+Electronics; Depth: 1.25mm; Mounting Type: Surface Mount, MLCC; ComponentLink9Description: http://www.farnell.com/datasheets/2243360.pdf?src-supplier=Newark; REACH SVHC: No SVHC; Mount: Surface Mount; Pricing 2: 1=0,53000, 10=0,37500, 50=0,28360, 100=0,24700, 500=0,18296, 1000=0,15551 (USD); Length: 2mm; ComponentLink2URL: https://datasheet.ciiva.com/25719/cl21a106kofnnne-25719922.pdf?src-supplier=Digi-Key; Operating Temperature: -55°C ~ 85°C; Voltage Rating (DC): 25V; Case Code (Imperial): 0805; RoHS: RoHS Compliant; ComponentLink1URL: http://www.murata.com/~/media/webrenewal/support/library/catalog/products/capacitor/mlcc/c02e.ashx; Case Code (Metric): 2012; Height: 1.25mm; Lead Spacing: -; Stock 1: 0; Dielectric: X5R; ComponentLink3URL: https://datasheet.ciiva.com/16494/cl21a106kofnnne-16494380.pdf?src-supplier=Future+Electronics; ComponentLink1Description: http://www.murata.com/~/media/webrenewal/support/library/catalog/products/capacitor/mlcc/c02e.ashx; Width: 0.049inch; ComponentLink7Description: http://www.farnell.com/datasheets/2243360.pdf?src-supplier=Element14; ComponentLink8URL: https://search.murata.co.jp/Ceramy/image/img/A01X/G101/ENG/ZRB18AR61E106ME01-01.pdf?src-supplier=Digi-Key; Source: mits.SchLib; ComponentLink5URL: http://www.farnell.com/datasheets/2243360.pdf?src-supplier=Farnell; Applications: General Purpose; Design Item ID: CAP CER 10UF 16V X5R 0603 SMD; Thickness: 0.053inch; Category: Capacitors; Part Status: Active; ComponentLink6URL: http://www.farnell.com/datasheets/1885591.pdf?src-supplier=Newark; Radiation Hardening: No; ComponentLink2Description: https://datasheet.ciiva.com/25719/cl21a106kofnnne-25719922.pdf?src-supplier=Digi-Key; Pricing 1: 1=0.18, 10=0.125, 50=0.0758, 100=0.0636, 250=0.05152, 500=0.04546, 1000=0.03863 (USD)
footprint CC1005-0402 (Chip Capacitor; Body 0.039" L x 0.020" W (1.00mm x 0.50mm))
footprint CC2012-0805 (Chip Capacitor)
pins: 1, 2

## CMP-004-00019-2
designator D?, comment CESD5V0AP
Uni-direction ESD Protection Diode, 5 V, 10 uA, 3-Pin SOT23, RoHS, Tape and Reel; Manufacturer: Jiangsu Changjiang Electronics Technology; Package Version: Rev. E, 09/2009; RoHS Compliant: Unknown; Mounting Technology: SM; Package Description: 3-Pin Small Outline Transistor, Body 2.9 x 1.3 mm, Pitch 0.95 mm; Datasheet URL: http://www.cj-elec.com/gallery/txUpfile/c44551eb678d297ed58d78171eee05d7.pdf; Case/Package: SOT23-3; Package URL: http://www.cj-elec.com/gallery/txUpfile/201412381536055.pdf; Package Reference: SOT23-3; Datasheet Version: Rev. C, 04/2014
footprint JSCJ-SOT23-3_V (SOT23, 3-Leads, Body 3x1.4mm, Pitch 0.95mm)
pins: 1 K, 2 K, 3 A

## CMP-004-000020-2
designator C?, comment CAP CER 10UF 16V X5R 0805 SMD  Manufacturer: Murata Electronics North America  Case/Package: 0805  Tolerance: ±10%  Max Operating Temperature: 85°C  Capacitance: 10µF  Package Quantity: 2000  Voltage Rating: 16V  Min Operating Temperature: -55°C  Packaging: Cut Tape (CT)
Cap Ceramic 10uF 16V X5R 10% Pad SMD 0805 85°C T/R; Manufacturer Part Number: GRM219R61A106KE44D; Voltage - Rated: 16; ComponentLink1Description: http://www.murata.com/~/media/webrenewal/support/library/catalog/products/capacitor/mlcc/c02e.ashx; Lead Style: -; Size / Dimension: 0.079" L x 0.049" W (2.00mm x 1.25mm); Temperature Coefficient: X5R; ComponentLink3URL: https://datasheet.ciiva.com/16494/cl21a106kofnnne-16494380.pdf?src-supplier=Future+Electronics; Case Code (Metric): 2012; ComponentLink2Description: https://datasheet.ciiva.com/25719/cl21a106kofnnne-25719922.pdf?src-supplier=Digi-Key; Height: 1.25mm; Ratings: -; Depth: 1.25mm; Design Item ID: CAP CER 10UF 16V X5R 0805 SMD; Features: -; Applications: General Purpose; Package / Case: 0805 (2012 Metric); Width: 0.049inch; Part Status: Active; Dielectric: X5R; Pricing 2: 1=0,26000, 10=0,17500, 100=0,09930, 500=0,07010, 1000=0,06133 (USD); Mount: Surface Mount; Category: Capacitors; Height - Seated (Max): -; Operating Temperature: -55°C ~ 85°C; ComponentLink4Description: https://datasheet.ciiva.com/26946/getdatasheetpartid-354009-26946990.pdf?src-supplier=Verical; Length: 2mm; Source: mits.SchLib; ComponentLink4URL: https://datasheet.ciiva.com/26946/getdatasheetpartid-354009-26946990.pdf?src-supplier=Verical; Radiation Hardening: No; RoHS: RoHS Compliant; Case Code (Imperial): 0805; Thickness: 0.053inch; ComponentLink1URL: http://www.murata.com/~/media/webrenewal/support/library/catalog/products/capacitor/mlcc/c02e.ashx; Thickness (Max): 0.037" (0.95mm); Stock 2: 503416; ComponentLink2URL: https://datasheet.ciiva.com/25719/cl21a106kofnnne-25719922.pdf?src-supplier=Digi-Key; Mounting Type: Surface Mount, MLCC; Lead Spacing: -; ComponentLink3Description: https://datasheet.ciiva.com/16494/cl21a106kofnnne-16494380.pdf?src-supplier=Future+Electronics; Pricing 1: 1=0.18, 10=0.125, 50=0.0758, 100=0.0636, 250=0.05152, 500=0.04546, 1000=0.03863 (USD); Stock 1: 0
footprint CC1005-0402 (Chip Capacitor; Body 0.039" L x 0.020" W (1.00mm x 0.50mm))
footprint CC2012-0805 (Chip Capacitor)
pins: 1, 2

## CMP-004-00020-2
designator D?, comment CESD5V0D1
Uni-driection ESD Protection Diode, 5 V, 1 uA, 2-Pin SOD-123, RoHS, Tape and Reel; Manufacturer: Jiangsu Changjiang Electronics Technology; Datasheet URL: http://www.cj-elec.com/gallery/txUpfile/f05a5831e2d7f622a930855050fbe076.pdf; Datasheet Version: Rev. B, 04/2014; Package Description: 2-Pin Surface Mount Device, Body 2.7 x 1.6 mm; Package Reference: SOD-123-2; RoHS Compliant: Unknown; Package URL: http://www.cj-elec.com/txUpfile/201412112231195145.pdf; Case/Package: SOD-123-2; Mounting Technology: SM
footprint JSCJ-SOD-123-2_V (SOD, 2-Leads, Body 2.7x1.6mm)
pins: 1 A, 2 K

## CMP-004-000021-2
designator C?, comment CAP CER 11nF 50V NP0 1206 SMD  Manufacturer: Murata Electronics North America  Packaging: Cut Tape (CT)  Tolerance: ±5%  Capacitance: 0.011µF
CAP CER 0.011UF 50V NP0 1206; Manufacturer Part Number: GRM3195C1H113JA01D; Temperature Coefficient: C0G, NP0; Size / Dimension: 0.126" L x 0.063" W (3.20mm x 1.60mm); Mounting Type: Surface Mount, MLCC; Thickness (Max): 0.037" (0.95mm); Lead Style: -; Applications: General Purpose; ComponentLink1Description: http://www.murata.com/~/media/webrenewal/support/library/catalog/products/capacitor/mlcc/c02e.pdf; Pricing 1: 1=0.53, 10=0.505, 50=0.3016, 100=0.2451, 250=0.2036, 500=0.18474, 1000=0.16965 (USD); Ratings: -; Source: mits.SchLib; Stock 1: 17660; Package / Case: 1206 (3216 Metric); Design Item ID: CAP CER 11nF 50V NP0 1206 SMD; RoHS: RoHS Compliant; Operating Temperature: -55°C ~ 125°C; Voltage - Rated: 50V; Lead Spacing: -; Features: -; Height - Seated (Max): -; Category: Capacitors; ComponentLink1URL: http://www.murata.com/~/media/webrenewal/support/library/catalog/products/capacitor/mlcc/c02e.pdf
footprint CC1005-0402 (Chip Capacitor; Body 0.039" L x 0.020" W (1.00mm x 0.50mm))
footprint CC3216-1206 (Chip Capacitor; Body 3.2 x 1.6 mm (LxW typ))
pins: 1, 2

## CMP-004-00021-2
designator D?, comment BZX79C3V6
Zener Diode, 3.6 V, 5 mA, -65 to 200 degC, 2-Pin DO-35, RoHS, Bulk; Manufacturer: Fairchild Semiconductor; Tolerance: 6%; Power: 500mW; Forward Voltage: 1.5V; Impedance: 90Ohm; Package Quantity: 1000; Min Operating Temperature: -65°C; Datasheet Version: Rev. C1, 07/2007; Max Operating Temperature: 200°C; Mounting Technology: TH; Package Description: 2-Pin Through Hole Diode, Dia 1.72 mm, Body Length 3.805 mm; RoHS Compliant: True; Manufacturer URL: https://www.fairchildsemi.com/; Package Reference: DO-35-2; Case/Package: DO-35-2; Datasheet URL: https://www.fairchildsemi.com/datasheets/BZ/BZX79C3V6.pdf; Package URL: https://www.fairchildsemi.com/package-drawings/DO/DO35A.pdf; Pins: 2; Packaging: Bulk
footprint FAIR-DO-35-2 (TH, 2-Leads, Dia 1.91mm)
pins: 1 A, 2 K

## CMP-004-000022-2
designator C?, comment CAP CER 15pF 50V NPO 0603 SMD  Packaging: Tape and Reel  Tolerance: 5%  Capacitance: 15pF  Case/Package: 0603  Max Operating Temperature: 125°C  Manufacturer: Samsung  Min Operating Temperature: -55°C  Voltage Rating: 50V  RoHS Compliant: Yes